# Altium footprint library IC.PCBLIB: 359 footprints (part 2 of 23)
Each footprint in its own frame and in the unit in brackets; x right, y up, seen from the top. Pads: shape width x height; smd on the part's side, far side on the other; paste and mask are expansions set on the pad; w line width, h text height; cw(c..) or ccw(c..) is an arc to the next point about the centre after c.
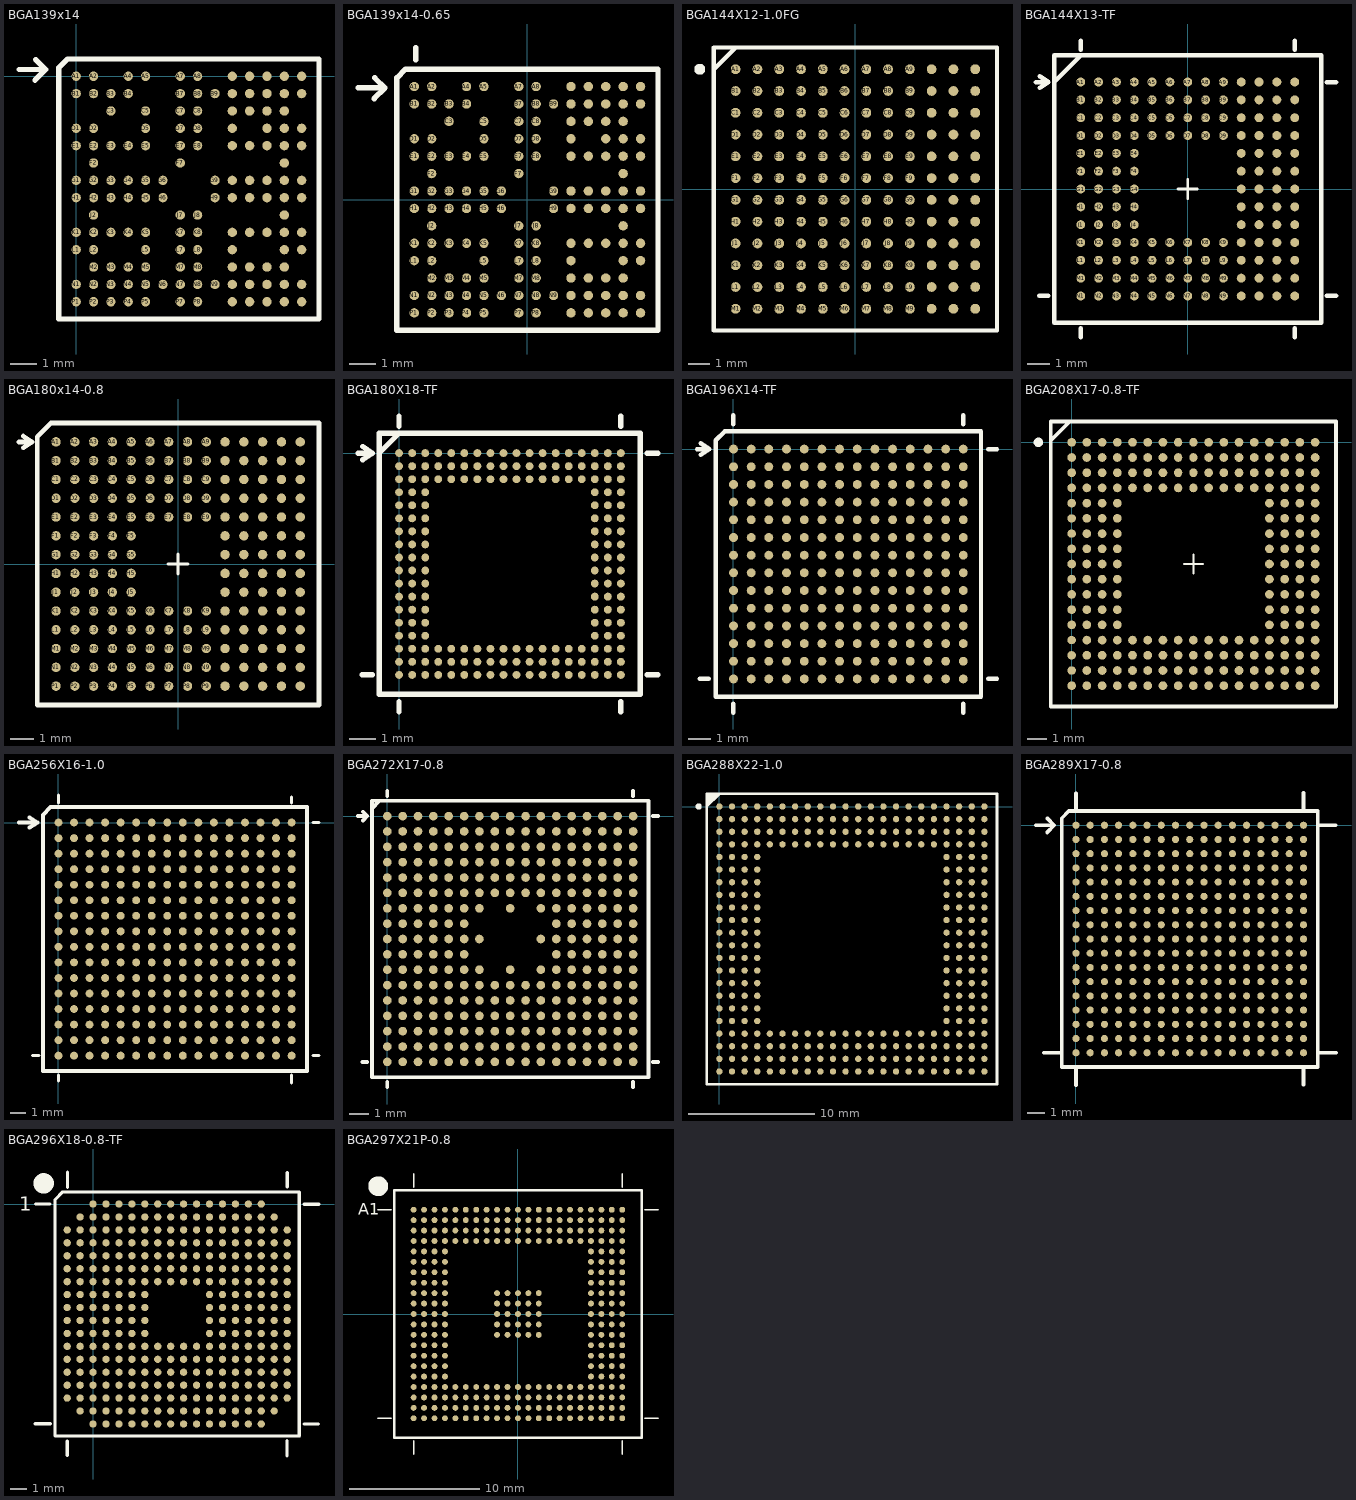
[diagram p1: the footprints below, top view; thin cyan lines are the x and y axes]

## BGA139x14 [mm]
pads (139):
  round 0.35 smd: A1(0,0) A2(0.65,0) A4(1.95,0) A5(2.6,0) A7(3.9,0) A8(4.55,0) A10(5.85,0) A11(6.5,0) A12(7.15,0) A13(7.8,0) A14(8.45,0) B1(0,-0.65) B2(0.65,-0.65) B3(1.3,-0.65) B4(1.95,-0.65) B7(3.9,-0.65) B8(4.55,-0.65) B9(5.2,-0.65) B10(5.85,-0.65) B11(6.5,-0.65) B12(7.15,-0.65) B13(7.8,-0.65) B14(8.45,-0.65) C3(1.3,-1.3) C5(2.6,-1.3) C7(3.9,-1.3) C8(4.55,-1.3) C10(5.85,-1.3) C11(6.5,-1.3) C12(7.15,-1.3) C13(7.8,-1.3) D1(0,-1.95) D2(0.65,-1.95) D5(2.6,-1.95) D7(3.9,-1.95) D8(4.55,-1.95) D10(5.85,-1.95) D12(7.15,-1.95) D13(7.8,-1.95) D14(8.45,-1.95) E1(0,-2.6) E2(0.65,-2.6) E3(1.3,-2.6) E4(1.95,-2.6) E5(2.6,-2.6) E7(3.9,-2.6) E8(4.55,-2.6) E10(5.85,-2.6) E11(6.5,-2.6) E12(7.15,-2.6) E13(7.8,-2.6) E14(8.45,-2.6) F2(0.65,-3.25) F7(3.9,-3.25) F13(7.8,-3.25) G1(0,-3.9) G2(0.65,-3.9) G3(1.3,-3.9) G4(1.95,-3.9) G5(2.6,-3.9) G6(3.25,-3.9) G9(5.2,-3.9) G10(5.85,-3.9) G11(6.5,-3.9) G12(7.15,-3.9) G13(7.8,-3.9) G14(8.45,-3.9) H1(0,-4.55) H2(0.65,-4.55) H3(1.3,-4.55) H4(1.95,-4.55) H5(2.6,-4.55) H6(3.25,-4.55) H9(5.2,-4.55) H10(5.85,-4.55) H11(6.5,-4.55) H12(7.15,-4.55) H13(7.8,-4.55) H14(8.45,-4.55) J2(0.65,-5.2) J7(3.9,-5.2) J8(4.55,-5.2) J13(7.8,-5.2) K1(0,-5.85) K2(0.65,-5.85) K3(1.3,-5.85) K4(1.95,-5.85) K5(2.6,-5.85) K7(3.9,-5.85) K8(4.55,-5.85) K10(5.85,-5.85) K11(6.5,-5.85) K12(7.15,-5.85) K13(7.8,-5.85) K14(8.45,-5.85) L1(0,-6.5) L2(0.65,-6.5) L5(2.6,-6.5) L7(3.9,-6.5) L8(4.55,-6.5) L10(5.85,-6.5) L13(7.8,-6.5) L14(8.45,-6.5) M2(0.65,-7.15) M3(1.3,-7.15) M4(1.95,-7.15) M5(2.6,-7.15) M7(3.9,-7.15) M8(4.55,-7.15) M10(5.85,-7.15) M11(6.5,-7.15) M12(7.15,-7.15) M13(7.8,-7.15) N1(0,-7.8) N2(0.65,-7.8) N3(1.3,-7.8) N4(1.95,-7.8) N5(2.6,-7.8) N6(3.25,-7.8) N7(3.9,-7.8) N8(4.55,-7.8) N9(5.2,-7.8) N10(5.85,-7.8) N11(6.5,-7.8) N12(7.15,-7.8) N13(7.8,-7.8) N14(8.45,-7.8) P1(0,-8.45) P2(0.65,-8.45) P3(1.3,-8.45) P4(1.95,-8.45) P5(2.6,-8.45) P7(3.9,-8.45) P8(4.55,-8.45) P10(5.85,-8.45) P11(6.5,-8.45) P12(7.15,-8.45) P13(7.8,-8.45) P14(8.45,-8.45)
TopOverlay:
  lines w0.2: -2.143,0.254 -1.143,0.254 ; -1.543,-0.146 -1.143,0.254 ; -1.518,0.629 -1.143,0.254 ; -0.65,-9.1 9.1,-9.1 9.1,0.65 -0.325,0.65 -0.65,0.325 -0.65,-9.1

## BGA139x14-0.65 [mm]
height 1.27
pads (139):
  round 0.35 smd: A1(-4.225,4.225) A2(-3.575,4.225) A4(-2.275,4.225) A5(-1.625,4.225) A7(-0.325,4.225) A8(0.325,4.225) A10(1.625,4.225) A11(2.275,4.225) A12(2.925,4.225) A13(3.575,4.225) A14(4.225,4.225) B1(-4.225,3.575) B2(-3.575,3.575) B3(-2.925,3.575) B4(-2.275,3.575) B7(-0.325,3.575) B8(0.325,3.575) B9(0.975,3.575) B10(1.625,3.575) B11(2.275,3.575) B12(2.925,3.575) B13(3.575,3.575) B14(4.225,3.575) C3(-2.925,2.925) C5(-1.625,2.925) C7(-0.325,2.925) C8(0.325,2.925) C10(1.625,2.925) C11(2.275,2.925) C12(2.925,2.925) C13(3.575,2.925) D1(-4.225,2.275) D2(-3.575,2.275) D5(-1.625,2.275) D7(-0.325,2.275) D8(0.325,2.275) D10(1.625,2.275) D12(2.925,2.275) D13(3.575,2.275) D14(4.225,2.275) E1(-4.225,1.625) E2(-3.575,1.625) E3(-2.925,1.625) E4(-2.275,1.625) E5(-1.625,1.625) E7(-0.325,1.625) E8(0.325,1.625) E10(1.625,1.625) E11(2.275,1.625) E12(2.925,1.625) E13(3.575,1.625) E14(4.225,1.625) F2(-3.575,0.975) F7(-0.325,0.975) F13(3.575,0.975) G1(-4.225,0.325) G2(-3.575,0.325) G3(-2.925,0.325) G4(-2.275,0.325) G5(-1.625,0.325) G6(-0.975,0.325) G9(0.975,0.325) G10(1.625,0.325) G11(2.275,0.325) G12(2.925,0.325) G13(3.575,0.325) G14(4.225,0.325) H1(-4.225,-0.325) H2(-3.575,-0.325) H3(-2.925,-0.325) H4(-2.275,-0.325) H5(-1.625,-0.325) H6(-0.975,-0.325) H9(0.975,-0.325) H10(1.625,-0.325) H11(2.275,-0.325) H12(2.925,-0.325) H13(3.575,-0.325) H14(4.225,-0.325) J2(-3.575,-0.975) J7(-0.325,-0.975) J8(0.325,-0.975) J13(3.575,-0.975) K1(-4.225,-1.625) K2(-3.575,-1.625) K3(-2.925,-1.625) K4(-2.275,-1.625) K5(-1.625,-1.625) K7(-0.325,-1.625) K8(0.325,-1.625) K10(1.625,-1.625) K11(2.275,-1.625) K12(2.925,-1.625) K13(3.575,-1.625) K14(4.225,-1.625) L1(-4.225,-2.275) L2(-3.575,-2.275) L5(-1.625,-2.275) L7(-0.325,-2.275) L8(0.325,-2.275) L10(1.625,-2.275) L13(3.575,-2.275) L14(4.225,-2.275) M2(-3.575,-2.925) M3(-2.925,-2.925) M4(-2.275,-2.925) M5(-1.625,-2.925) M7(-0.325,-2.925) M8(0.325,-2.925) M10(1.625,-2.925) M11(2.275,-2.925) M12(2.925,-2.925) M13(3.575,-2.925) N1(-4.225,-3.575) N2(-3.575,-3.575) N3(-2.925,-3.575) N4(-2.275,-3.575) N5(-1.625,-3.575) N6(-0.975,-3.575) N7(-0.325,-3.575) N8(0.325,-3.575) N9(0.975,-3.575) N10(1.625,-3.575) N11(2.275,-3.575) N12(2.925,-3.575) N13(3.575,-3.575) N14(4.225,-3.575) P1(-4.225,-4.225) P2(-3.575,-4.225) P3(-2.925,-4.225) P4(-2.275,-4.225) P5(-1.625,-4.225) P7(-0.325,-4.225) P8(0.325,-4.225) P10(1.625,-4.225) P11(2.275,-4.225) P12(2.925,-4.225) P13(3.575,-4.225) P14(4.225,-4.225)
TopOverlay:
  lines w0.2: -6.325,4.175 -5.325,4.175 ; -5.725,3.775 -5.325,4.175 ; -5.7,4.55 -5.325,4.175 ; -4.175,5.225 -4.175,5.675 ; -4.875,-4.875 4.875,-4.875 4.875,4.875 -4.55,4.875 -4.875,4.55 -4.875,-4.875

## BGA144X12-1.0FG [mm]
height 1.524
pads (144):
  round 0.45 smd: A1(-5.501,5.504) A2(-4.501,5.504) A3(-3.501,5.504) A4(-2.501,5.504) A5(-1.501,5.504) A6(-0.501,5.504) A7(0.499,5.504) A8(1.499,5.504) A9(2.499,5.504) A10(3.499,5.504) A11(4.499,5.504) A12(5.499,5.504) B1(-5.501,4.504) B2(-4.501,4.504) B3(-3.501,4.504) B4(-2.501,4.504) B5(-1.501,4.504) B6(-0.501,4.504) B7(0.499,4.504) B8(1.499,4.504) B9(2.499,4.504) B10(3.499,4.504) B11(4.499,4.504) B12(5.499,4.504) C1(-5.501,3.504) C2(-4.501,3.504) C3(-3.501,3.504) C4(-2.501,3.504) C5(-1.501,3.504) C6(-0.501,3.504) C7(0.499,3.504) C8(1.499,3.504) C9(2.499,3.504) C10(3.499,3.504) C11(4.499,3.504) C12(5.499,3.504) D1(-5.501,2.504) D2(-4.501,2.504) D3(-3.501,2.504) D4(-2.501,2.504) D5(-1.501,2.504) D6(-0.501,2.504) D7(0.499,2.504) D8(1.499,2.504) D9(2.499,2.504) D10(3.499,2.504) D11(4.499,2.504) D12(5.499,2.504) E1(-5.501,1.504) E2(-4.501,1.504) E3(-3.501,1.504) E4(-2.501,1.504) E5(-1.501,1.504) E6(-0.501,1.504) E7(0.499,1.504) E8(1.499,1.504) E9(2.499,1.504) E10(3.499,1.504) E11(4.499,1.504) E12(5.499,1.504) F1(-5.501,0.504) F2(-4.501,0.504) F3(-3.501,0.504) F4(-2.501,0.504) F5(-1.501,0.504) F6(-0.501,0.504) F7(0.499,0.504) F8(1.499,0.504) F9(2.499,0.504) F10(3.499,0.504) F11(4.499,0.504) F12(5.499,0.504) G1(-5.501,-0.496) G2(-4.501,-0.496) G3(-3.501,-0.496) G4(-2.501,-0.496) G5(-1.501,-0.496) G6(-0.501,-0.496) G7(0.499,-0.496) G8(1.499,-0.496) G9(2.499,-0.496) G10(3.499,-0.496) G11(4.499,-0.496) G12(5.499,-0.496) H1(-5.501,-1.496) H2(-4.501,-1.496) H3(-3.501,-1.496) H4(-2.501,-1.496) H5(-1.501,-1.496) H6(-0.501,-1.496) H7(0.499,-1.496) H8(1.499,-1.496) H9(2.499,-1.496) H10(3.499,-1.496) H11(4.499,-1.496) H12(5.499,-1.496) J1(-5.501,-2.496) J2(-4.501,-2.496) J3(-3.501,-2.496) J4(-2.501,-2.496) J5(-1.501,-2.496) J6(-0.501,-2.496) J7(0.499,-2.496) J8(1.499,-2.496) J9(2.499,-2.496) J10(3.499,-2.496) J11(4.499,-2.496) J12(5.499,-2.496) K1(-5.501,-3.496) K2(-4.501,-3.496) K3(-3.501,-3.496) K4(-2.501,-3.496) K5(-1.501,-3.496) K6(-0.501,-3.496) K7(0.499,-3.496) K8(1.499,-3.496) K9(2.499,-3.496) K10(3.499,-3.496) K11(4.499,-3.496) K12(5.499,-3.496) L1(-5.501,-4.496) L2(-4.501,-4.496) L3(-3.501,-4.496) L4(-2.501,-4.496) L5(-1.501,-4.496) L6(-0.501,-4.496) L7(0.499,-4.496) L8(1.499,-4.496) L9(2.499,-4.496) L10(3.499,-4.496) L11(4.499,-4.496) L12(5.499,-4.496) M1(-5.501,-5.496) M2(-4.501,-5.496) M3(-3.501,-5.496) M4(-2.501,-5.496) M5(-1.501,-5.496) M6(-0.501,-5.496) M7(0.499,-5.496) M8(1.499,-5.496) M9(2.499,-5.496) M10(3.499,-5.496) M11(4.499,-5.496) M12(5.499,-5.496)
TopOverlay:
  circle w0.25: c-7.151,5.504 r0.125
  lines w0.2: -6.501,5.504 -5.501,6.504 ; -6.501,-6.496 6.499,-6.496 6.499,6.504 -6.501,6.504 -6.501,-6.496

## BGA144X13-TF [mm]
pads (144):
  round 0.4 smd: A1(-4.8,4.8) A2(-4,4.8) A3(-3.2,4.8) A4(-2.4,4.8) A5(-1.6,4.8) A6(-0.8,4.8) A7(0,4.8) A8(0.8,4.8) A9(1.6,4.8) A10(2.4,4.8) A11(3.2,4.8) A12(4,4.8) A13(4.8,4.8) B1(-4.8,4) B2(-4,4) B3(-3.2,4) B4(-2.4,4) B5(-1.6,4) B6(-0.8,4) B7(0,4) B8(0.8,4) B9(1.6,4) B10(2.4,4) B11(3.2,4) B12(4,4) B13(4.8,4) C1(-4.8,3.2) C2(-4,3.2) C3(-3.2,3.2) C4(-2.4,3.2) C5(-1.6,3.2) C6(-0.8,3.2) C7(0,3.2) C8(0.8,3.2) C9(1.6,3.2) C10(2.4,3.2) C11(3.2,3.2) C12(4,3.2) C13(4.8,3.2) D1(-4.8,2.4) D2(-4,2.4) D3(-3.2,2.4) D4(-2.4,2.4) D5(-1.6,2.4) D6(-0.8,2.4) D7(0,2.4) D8(0.8,2.4) D9(1.6,2.4) D10(2.4,2.4) D11(3.2,2.4) D12(4,2.4) D13(4.8,2.4) E1(-4.8,1.6) E2(-4,1.6) E3(-3.2,1.6) E4(-2.4,1.6) E10(2.4,1.6) E11(3.2,1.6) E12(4,1.6) E13(4.8,1.6) F1(-4.8,0.8) F2(-4,0.8) F3(-3.2,0.8) F4(-2.4,0.8) F10(2.4,0.8) F11(3.2,0.8) F12(4,0.8) F13(4.8,0.8) G1(-4.8,0) G2(-4,0) G3(-3.2,0) G4(-2.4,0) G10(2.4,0) G11(3.2,0) G12(4,0) G13(4.8,0) H1(-4.8,-0.8) H2(-4,-0.8) H3(-3.2,-0.8) H4(-2.4,-0.8) H10(2.4,-0.8) H11(3.2,-0.8) H12(4,-0.8) H13(4.8,-0.8) J1(-4.8,-1.6) J2(-4,-1.6) J3(-3.2,-1.6) J4(-2.4,-1.6) J10(2.4,-1.6) J11(3.2,-1.6) J12(4,-1.6) J13(4.8,-1.6) K1(-4.8,-2.4) K2(-4,-2.4) K3(-3.2,-2.4) K4(-2.4,-2.4) K5(-1.6,-2.4) K6(-0.8,-2.4) K7(0,-2.4) K8(0.8,-2.4) K9(1.6,-2.4) K10(2.4,-2.4) K11(3.2,-2.4) K12(4,-2.4) K13(4.8,-2.4) L1(-4.8,-3.2) L2(-4,-3.2) L3(-3.2,-3.2) L4(-2.4,-3.2) L5(-1.6,-3.2) L6(-0.8,-3.2) L7(0,-3.2) L8(0.8,-3.2) L9(1.6,-3.2) L10(2.4,-3.2) L11(3.2,-3.2) L12(4,-3.2) L13(4.8,-3.2) M1(-4.8,-4) M2(-4,-4) M3(-3.2,-4) M4(-2.4,-4) M5(-1.6,-4) M6(-0.8,-4) M7(0,-4) M8(0.8,-4) M9(1.6,-4) M10(2.4,-4) M11(3.2,-4) M12(4,-4) M13(4.8,-4) N1(-4.8,-4.8) N2(-4,-4.8) N3(-3.2,-4.8) N4(-2.4,-4.8) N5(-1.6,-4.8) N6(-0.8,-4.8) N7(0,-4.8) N8(0.8,-4.8) N9(1.6,-4.8) N10(2.4,-4.8) N11(3.2,-4.8) N12(4,-4.8) N13(4.8,-4.8)
TopOverlay:
  lines w0.127: -0.432,0 0,0 ; 0,-0.432 0,0 ; 0,0.432 0,0 ; 0.432,0 0,0
  lines w0.2: -5.994,4.8 -4.8,5.994
  lines w0.203: -6.807,4.8 -6.248,4.8 ; -6.654,-4.8 -6.248,-4.8 ; -6.629,4.546 -6.248,4.8 ; -6.629,5.054 -6.248,4.8 ; -4.8,-6.654 -4.8,-6.248 ; -4.8,6.248 -4.8,6.654 ; 4.8,-6.654 4.8,-6.248 ; 4.8,6.248 4.8,6.654 ; 6.248,-4.8 6.654,-4.8 ; 6.248,4.8 6.654,4.8 ; -5.994,-5.995 5.995,-5.995 5.995,5.994 -5.994,5.994 -5.994,-5.995

## BGA180x14-0.8 [mm] "LPC313X"
pads (180):
  round 0.4 smd: A1(-5.2,5.2) A2(-4.4,5.2) A3(-3.6,5.2) A4(-2.8,5.2) A5(-2,5.2) A6(-1.2,5.2) A7(-0.4,5.2) A8(0.4,5.2) A9(1.2,5.2) A10(2,5.2) A11(2.8,5.2) A12(3.6,5.2) A13(4.4,5.2) A14(5.2,5.2) B1(-5.2,4.4) B2(-4.4,4.4) B3(-3.6,4.4) B4(-2.8,4.4) B5(-2,4.4) B6(-1.2,4.4) B7(-0.4,4.4) B8(0.4,4.4) B9(1.2,4.4) B10(2,4.4) B11(2.8,4.4) B12(3.6,4.4) B13(4.4,4.4) B14(5.2,4.4) C1(-5.2,3.6) C2(-4.4,3.6) C3(-3.6,3.6) C4(-2.8,3.6) C5(-2,3.6) C6(-1.2,3.6) C7(-0.4,3.6) C8(0.4,3.6) C9(1.2,3.6) C10(2,3.6) C11(2.8,3.6) C12(3.6,3.6) C13(4.4,3.6) C14(5.2,3.6) D1(-5.2,2.8) D2(-4.4,2.8) D3(-3.6,2.8) D4(-2.8,2.8) D5(-2,2.8) D6(-1.2,2.8) D7(-0.4,2.8) D8(0.4,2.8) D9(1.2,2.8) D10(2,2.8) D11(2.8,2.8) D12(3.6,2.8) D13(4.4,2.8) D14(5.2,2.8) E1(-5.2,2) E2(-4.4,2) E3(-3.6,2) E4(-2.8,2) E5(-2,2) E6(-1.2,2) E7(-0.4,2) E8(0.4,2) E9(1.2,2) E10(2,2) E11(2.8,2) E12(3.6,2) E13(4.4,2) E14(5.2,2) F1(-5.2,1.2) F2(-4.4,1.2) F3(-3.6,1.2) F4(-2.8,1.2) F5(-2,1.2) F10(2,1.2) F11(2.8,1.2) F12(3.6,1.2) F13(4.4,1.2) F14(5.2,1.2) G1(-5.2,0.4) G2(-4.4,0.4) G3(-3.6,0.4) G4(-2.8,0.4) G5(-2,0.4) G10(2,0.4) G11(2.8,0.4) G12(3.6,0.4) G13(4.4,0.4) G14(5.2,0.4) H1(-5.2,-0.4) H2(-4.4,-0.4) H3(-3.6,-0.4) H4(-2.8,-0.4) H5(-2,-0.4) H10(2,-0.4) H11(2.8,-0.4) H12(3.6,-0.4) H13(4.4,-0.4) H14(5.2,-0.4) J1(-5.2,-1.2) J2(-4.4,-1.2) J3(-3.6,-1.2) J4(-2.8,-1.2) J5(-2,-1.2) J10(2,-1.2) J11(2.8,-1.2) J12(3.6,-1.2) J13(4.4,-1.2) J14(5.2,-1.2) K1(-5.2,-2) K2(-4.4,-2) K3(-3.6,-2) K4(-2.8,-2) K5(-2,-2) K6(-1.2,-2) K7(-0.4,-2) K8(0.4,-2) K9(1.2,-2) K10(2,-2) K11(2.8,-2) K12(3.6,-2) K13(4.4,-2) K14(5.2,-2) L1(-5.2,-2.8) L2(-4.4,-2.8) L3(-3.6,-2.8) L4(-2.8,-2.8) L5(-2,-2.8) L6(-1.2,-2.8) L7(-0.4,-2.8) L8(0.4,-2.8) L9(1.2,-2.8) L10(2,-2.8) L11(2.8,-2.8) L12(3.6,-2.8) L13(4.4,-2.8) L14(5.2,-2.8) M1(-5.2,-3.6) M2(-4.4,-3.6) M3(-3.6,-3.6) M4(-2.8,-3.6) M5(-2,-3.6) M6(-1.2,-3.6) M7(-0.4,-3.6) M8(0.4,-3.6) M9(1.2,-3.6) M10(2,-3.6) M11(2.8,-3.6) M12(3.6,-3.6) M13(4.4,-3.6) M14(5.2,-3.6) N1(-5.2,-4.4) N2(-4.4,-4.4) N3(-3.6,-4.4) N4(-2.8,-4.4) N5(-2,-4.4) N6(-1.2,-4.4) N7(-0.4,-4.4) N8(0.4,-4.4) N9(1.2,-4.4) N10(2,-4.4) N11(2.8,-4.4) N12(3.6,-4.4) N13(4.4,-4.4) N14(5.2,-4.4) P1(-5.2,-5.2) P2(-4.4,-5.2) P3(-3.6,-5.2) P4(-2.8,-5.2) P5(-2,-5.2) P6(-1.2,-5.2) P7(-0.4,-5.2) P8(0.4,-5.2) P9(1.2,-5.2) P10(2,-5.2) P11(2.8,-5.2) P12(3.6,-5.2) P13(4.4,-5.2) P14(5.2,-5.2)
TopOverlay:
  lines w0.127: -0.432,0 0,0 ; 0,-0.432 0,0 ; 0,0.432 0,0 ; 0.432,0 0,0
  lines w0.2: -6,-6 6,-6 6,6 -5.416,6 -6,5.416 -6,-6
  lines w0.203: -6.775,5.2 -6.216,5.2 ; -6.597,4.946 -6.216,5.2 ; -6.597,5.454 -6.216,5.2

## BGA180X18-TF [mm]
pads (180):
  round 0.3 smd: A1(0,0) A2(0.5,0) A3(1,0) A4(1.5,0) A5(2,0) A6(2.5,0) A7(3,0) A8(3.5,0) A9(4,0) A10(4.5,0) A11(5,0) A12(5.5,0) A13(6,0) A14(6.5,0) A15(7,0) A16(7.5,0) A17(8,0) A18(8.5,0) B1(0,-0.5) B2(0.5,-0.5) B3(1,-0.5) B4(1.5,-0.5) B5(2,-0.5) B6(2.5,-0.5) B7(3,-0.5) B8(3.5,-0.5) B9(4,-0.5) B10(4.5,-0.5) B11(5,-0.5) B12(5.5,-0.5) B13(6,-0.5) B14(6.5,-0.5) B15(7,-0.5) B16(7.5,-0.5) B17(8,-0.5) B18(8.5,-0.5) C1(0,-1) C2(0.5,-1) C3(1,-1) C4(1.5,-1) C5(2,-1) C6(2.5,-1) C7(3,-1) C8(3.5,-1) C9(4,-1) C10(4.5,-1) C11(5,-1) C12(5.5,-1) C13(6,-1) C14(6.5,-1) C15(7,-1) C16(7.5,-1) C17(8,-1) C18(8.5,-1) D1(0,-1.5) D2(0.5,-1.5) D3(1,-1.5) D16(7.5,-1.5) D17(8,-1.5) D18(8.5,-1.5) E1(0,-2) E2(0.5,-2) E3(1,-2) E16(7.5,-2) E17(8,-2) E18(8.5,-2) F1(0,-2.5) F2(0.5,-2.5) F3(1,-2.5) F16(7.5,-2.5) F17(8,-2.5) F18(8.5,-2.5) G1(0,-3) G2(0.5,-3) G3(1,-3) G16(7.5,-3) G17(8,-3) G18(8.5,-3) H1(0,-3.5) H2(0.5,-3.5) H3(1,-3.5) H16(7.5,-3.5) H17(8,-3.5) H18(8.5,-3.5) J1(0,-4) J2(0.5,-4) J3(1,-4) J16(7.5,-4) J17(8,-4) J18(8.5,-4) K1(0,-4.5) K2(0.5,-4.5) K3(1,-4.5) K16(7.5,-4.5) K17(8,-4.5) K18(8.5,-4.5) L1(0,-5) L2(0.5,-5) L3(1,-5) L16(7.5,-5) L17(8,-5) L18(8.5,-5) M1(0,-5.5) M2(0.5,-5.5) M3(1,-5.5) M16(7.5,-5.5) M17(8,-5.5) M18(8.5,-5.5) N1(0,-6) N2(0.5,-6) N3(1,-6) N16(7.5,-6) N17(8,-6) N18(8.5,-6) P1(0,-6.5) P2(0.5,-6.5) P3(1,-6.5) P16(7.5,-6.5) P17(8,-6.5) P18(8.5,-6.5) R1(0,-7) R2(0.5,-7) R3(1,-7) R16(7.5,-7) R17(8,-7) R18(8.5,-7) T1(0,-7.5) T2(0.5,-7.5) T3(1,-7.5) T4(1.5,-7.5) T5(2,-7.5) T6(2.5,-7.5) T7(3,-7.5) T8(3.5,-7.5) T9(4,-7.5) T10(4.5,-7.5) T11(5,-7.5) T12(5.5,-7.5) T13(6,-7.5) T14(6.5,-7.5) T15(7,-7.5) T16(7.5,-7.5) T17(8,-7.5) T18(8.5,-7.5) U1(0,-8) U2(0.5,-8) U3(1,-8) U4(1.5,-8) U5(2,-8) U6(2.5,-8) U7(3,-8) U8(3.5,-8) U9(4,-8) U10(4.5,-8) U11(5,-8) U12(5.5,-8) U13(6,-8) U14(6.5,-8) U15(7,-8) U16(7.5,-8) U17(8,-8) U18(8.5,-8) V1(0,-8.5) V2(0.5,-8.5) V3(1,-8.5) V4(1.5,-8.5) V5(2,-8.5) V6(2.5,-8.5) V7(3,-8.5) V8(3.5,-8.5) V9(4,-8.5) V10(4.5,-8.5) V11(5,-8.5) V12(5.5,-8.5) V13(6,-8.5) V14(6.5,-8.5) V15(7,-8.5) V16(7.5,-8.5) V17(8,-8.5) V18(8.5,-8.5)
TopOverlay:
  lines w0.2: -0.762,0 0,0.762
  lines w0.203: -1.575,0 -1.016,0 ; -1.422,-8.5 -1.016,-8.5 ; -1.397,-0.254 -1.016,0 ; -1.397,0.254 -1.016,0 ; 0,-9.922 0,-9.516 ; 0,1.016 0,1.422 ; 8.5,-9.922 8.5,-9.516 ; 8.5,1.016 8.5,1.422 ; 9.516,-8.5 9.922,-8.5 ; 9.516,0 9.922,0 ; -0.762,-9.246 -0.762,0.762 9.246,0.762 9.246,-9.246 -0.762,-9.246

## BGA196X14-TF [mm]
pads (196):
  round 0.4 smd: A1(0,0) A2(0.8,0) A3(1.6,0) A4(2.4,0) A5(3.2,0) A6(4,0) A7(4.8,0) A8(5.6,0) A9(6.4,0) A10(7.2,0) A11(8,0) A12(8.8,0) A13(9.6,0) A14(10.4,0) B1(0,-0.8) B2(0.8,-0.8) B3(1.6,-0.8) B4(2.4,-0.8) B5(3.2,-0.8) B6(4,-0.8) B7(4.8,-0.8) B8(5.6,-0.8) B9(6.4,-0.8) B10(7.2,-0.8) B11(8,-0.8) B12(8.8,-0.8) B13(9.6,-0.8) B14(10.4,-0.8) C1(0,-1.6) C2(0.8,-1.6) C3(1.6,-1.6) C4(2.4,-1.6) C5(3.2,-1.6) C6(4,-1.6) C7(4.8,-1.6) C8(5.6,-1.6) C9(6.4,-1.6) C10(7.2,-1.6) C11(8,-1.6) C12(8.8,-1.6) C13(9.6,-1.6) C14(10.4,-1.6) D1(0,-2.4) D2(0.8,-2.4) D3(1.6,-2.4) D4(2.4,-2.4) D5(3.2,-2.4) D6(4,-2.4) D7(4.8,-2.4) D8(5.6,-2.4) D9(6.4,-2.4) D10(7.2,-2.4) D11(8,-2.4) D12(8.8,-2.4) D13(9.6,-2.4) D14(10.4,-2.4) E1(0,-3.2) E2(0.8,-3.2) E3(1.6,-3.2) E4(2.4,-3.2) E5(3.2,-3.2) E6(4,-3.2) E7(4.8,-3.2) E8(5.6,-3.2) E9(6.4,-3.2) E10(7.2,-3.2) E11(8,-3.2) E12(8.8,-3.2) E13(9.6,-3.2) E14(10.4,-3.2) F1(0,-4) F2(0.8,-4) F3(1.6,-4) F4(2.4,-4) F5(3.2,-4) F6(4,-4) F7(4.8,-4) F8(5.6,-4) F9(6.4,-4) F10(7.2,-4) F11(8,-4) F12(8.8,-4) F13(9.6,-4) F14(10.4,-4) G1(0,-4.8) G2(0.8,-4.8) G3(1.6,-4.8) G4(2.4,-4.8) G5(3.2,-4.8) G6(4,-4.8) G7(4.8,-4.8) G8(5.6,-4.8) G9(6.4,-4.8) G10(7.2,-4.8) G11(8,-4.8) G12(8.8,-4.8) G13(9.6,-4.8) G14(10.4,-4.8) H1(0,-5.6) H2(0.8,-5.6) H3(1.6,-5.6) H4(2.4,-5.6) H5(3.2,-5.6) H6(4,-5.6) H7(4.8,-5.6) H8(5.6,-5.6) H9(6.4,-5.6) H10(7.2,-5.6) H11(8,-5.6) H12(8.8,-5.6) H13(9.6,-5.6) H14(10.4,-5.6) J1(0,-6.4) J2(0.8,-6.4) J3(1.6,-6.4) J4(2.4,-6.4) J5(3.2,-6.4) J6(4,-6.4) J7(4.8,-6.4) J8(5.6,-6.4) J9(6.4,-6.4) J10(7.2,-6.4) J11(8,-6.4) J12(8.8,-6.4) J13(9.6,-6.4) J14(10.4,-6.4) K1(0,-7.2) K2(0.8,-7.2) K3(1.6,-7.2) K4(2.4,-7.2) K5(3.2,-7.2) K6(4,-7.2) K7(4.8,-7.2) K8(5.6,-7.2) K9(6.4,-7.2) K10(7.2,-7.2) K11(8,-7.2) K12(8.8,-7.2) K13(9.6,-7.2) K14(10.4,-7.2) L1(0,-8) L2(0.8,-8) L3(1.6,-8) L4(2.4,-8) L5(3.2,-8) L6(4,-8) L7(4.8,-8) L8(5.6,-8) L9(6.4,-8) L10(7.2,-8) L11(8,-8) L12(8.8,-8) L13(9.6,-8) L14(10.4,-8) M1(0,-8.8) M2(0.8,-8.8) M3(1.6,-8.8) M4(2.4,-8.8) M5(3.2,-8.8) M6(4,-8.8) M7(4.8,-8.8) M8(5.6,-8.8) M9(6.4,-8.8) M10(7.2,-8.8) M11(8,-8.8) M12(8.8,-8.8) M13(9.6,-8.8) M14(10.4,-8.8) N1(0,-9.6) N2(0.8,-9.6) N3(1.6,-9.6) N4(2.4,-9.6) N5(3.2,-9.6) N6(4,-9.6) N7(4.8,-9.6) N8(5.6,-9.6) N9(6.4,-9.6) N10(7.2,-9.6) N11(8,-9.6) N12(8.8,-9.6) N13(9.6,-9.6) N14(10.4,-9.6) P1(0,-10.4) P2(0.8,-10.4) P3(1.6,-10.4) P4(2.4,-10.4) P5(3.2,-10.4) P6(4,-10.4) P7(4.8,-10.4) P8(5.6,-10.4) P9(6.4,-10.4) P10(7.2,-10.4) P11(8,-10.4) P12(8.8,-10.4) P13(9.6,-10.4) P14(10.4,-10.4)
TopOverlay:
  lines w0.2: -0.8,-11.2 -0.8,0.4 -0.4,0.8 11.2,0.8 11.2,-11.2 -0.8,-11.2
  lines w0.203: -1.651,0 -1.092,0 ; -1.524,-10.4 -1.118,-10.4 ; -1.473,-0.254 -1.092,0 ; -1.473,0.254 -1.092,0 ; 0,-11.924 0,-11.518 ; 0,1.118 0,1.524 ; 10.4,-11.924 10.4,-11.518 ; 10.4,1.118 10.4,1.524 ; 11.518,-10.4 11.924,-10.4 ; 11.518,0 11.924,0

## BGA208X17-0.8-TF [mil]
height 70
pads (208):
  round 18 smd: A1(0,0) A2(31.5,0) A3(62.99,0) A4(94.49,0) A5(125.98,0) A6(157.48,0) A7(188.98,0) A10(283.46,0) A11(314.96,0) A12(346.46,0) A13(377.95,0) A14(409.45,0) A15(440.95,0) A16(472.44,0) A17(503.94,0) B1(0,-31.5) B2(31.5,-31.5) B3(62.99,-31.5) B4(94.49,-31.5) B5(125.98,-31.5) B6(157.48,-31.5) B7(188.98,-31.5) B10(283.46,-31.5) B11(314.96,-31.5) B12(346.46,-31.5) B13(377.95,-31.5) B14(409.45,-31.5) B15(440.95,-31.5) B16(472.44,-31.5) B17(503.94,-31.5) C1(0,-62.99) C2(31.5,-62.99) C3(62.99,-62.99) C4(94.49,-62.99) C5(125.98,-62.99) C6(157.48,-62.99) C7(188.98,-62.99) C10(283.46,-62.99) C11(314.96,-62.99) C12(346.46,-62.99) C13(377.95,-62.99) C14(409.45,-62.99) C15(440.95,-62.99) C16(472.44,-62.99) C17(503.94,-62.99) D1(0,-94.49) D2(31.5,-94.49) D3(62.99,-94.49) D4(94.49,-94.49) D5(125.98,-94.49) D6(157.48,-94.49) D7(188.98,-94.49) D10(283.46,-94.49) D11(314.96,-94.49) D12(346.46,-94.49) D13(377.95,-94.49) D14(409.45,-94.49) D15(440.95,-94.49) D16(472.44,-94.49) D17(503.94,-94.49) E1(0,-125.98) E2(31.5,-125.98) E3(62.99,-125.98) E4(94.49,-125.98) E14(409.45,-125.98) E15(440.95,-125.98) E16(472.44,-125.98) E17(503.94,-125.98) F2(31.5,-157.48) F3(62.99,-157.48) F4(94.49,-157.48) F14(409.45,-157.48) F15(440.95,-157.48) F16(472.44,-157.48) F17(503.94,-157.48) G2(31.5,-188.98) G3(62.99,-188.98) G4(94.49,-188.98) G14(409.45,-188.98) G15(440.95,-188.98) G16(472.44,-188.98) G17(503.94,-188.98) H1(0,-220.47) H2(31.5,-220.47) H3(62.99,-220.47) H4(94.49,-220.47) H14(409.45,-220.47) H15(440.95,-220.47) H16(472.44,-220.47) H17(503.94,-220.47) J1(0,-251.97) J2(31.5,-251.97) J3(62.99,-251.97) J4(94.49,-251.97) J14(409.45,-251.97) J15(440.95,-251.97) J16(472.44,-251.97) J17(503.94,-251.97) K1(0,-283.46) K2(31.5,-283.46) K3(62.99,-283.46) K4(94.49,-283.46) K14(409.45,-283.46) K15(440.95,-283.46) K16(472.44,-283.46) K17(503.94,-283.46) L1(0,-314.96) L2(31.5,-314.96) L3(62.99,-314.96) L4(94.49,-314.96) L14(409.45,-314.96) L15(440.95,-314.96) L16(472.44,-314.96) L17(503.94,-314.96) M1(0,-346.46) M2(31.5,-346.46) M3(62.99,-346.46) M4(94.49,-346.46) M14(409.45,-346.46) M15(440.95,-346.46) M16(472.44,-346.46) M17(503.94,-346.46) N1(0,-377.95) N2(31.5,-377.95) N3(62.99,-377.95) N4(94.49,-377.95) N14(409.45,-377.95) N15(440.95,-377.95) N16(472.44,-377.95) N17(503.94,-377.95) P2(31.5,-409.45) P3(62.99,-409.45) P4(94.49,-409.45) P5(125.98,-409.45) P6(157.48,-409.45) P7(188.98,-409.45) P8(220.47,-409.45) P9(251.97,-409.45) P10(283.46,-409.45) P11(314.96,-409.45) P12(346.46,-409.45) P13(377.95,-409.45) P14(409.45,-409.45) P15(440.95,-409.45) P16(472.44,-409.45) P17(503.94,-409.45) R2(31.5,-440.95) R3(62.99,-440.95) R4(94.49,-440.95) R5(125.98,-440.95) R6(157.48,-440.95) R7(188.98,-440.95) R8(220.47,-440.95) R9(251.97,-440.95) R10(283.46,-440.95) R11(314.96,-440.95) R12(346.46,-440.95) R13(377.95,-440.95) R14(409.45,-440.95) R15(440.95,-440.95) R16(472.44,-440.95) R17(503.94,-440.95) T2(31.5,-472.44) T3(62.99,-472.44) T4(94.49,-472.44) T5(125.98,-472.44) T6(157.48,-472.44) T7(188.98,-472.44) T8(220.47,-472.44) T9(251.97,-472.44) T10(283.46,-472.44) T11(314.96,-472.44) T12(346.46,-472.44) T13(377.95,-472.44) T14(409.45,-472.44) T15(440.95,-472.44) T16(472.44,-472.44) T17(503.94,-472.44) U1(0,-503.94) U2(31.5,-503.94) U3(62.99,-503.94) U4(94.49,-503.94) U5(125.98,-503.94) U6(157.48,-503.94) U7(188.98,-503.94) U8(220.47,-503.94) U9(251.97,-503.94) U10(283.46,-503.94) U11(314.96,-503.94) U12(346.46,-503.94) U13(377.95,-503.94) U14(409.45,-503.94) U15(440.95,-503.94) U16(472.44,-503.94) U17(503.94,-503.94)
  oval 17x18 smd: A8(220.47,0) A9(251.97,0) B8(220.47,-31.5) B9(251.97,-31.5) C8(220.47,-62.99) C9(251.97,-62.99) D8(220.47,-94.49) D9(251.97,-94.49)
  oval 18x17 smd: F1(0,-157.48) G1(0,-188.98) P1(0,-409.45) R1(0,-440.94) T1(0,-472.44)